# Altium footprint library KNR_Kurs.PcbLib: 250 footprints (part 5 of 16)
Each footprint in its own frame and in the unit in brackets; x right, y up, seen from the top. Pads: shape width x height; smd on the part's side, far side on the other; paste and mask are expansions set on the pad; w line width, h text height; cw(c..) or ccw(c..) is an arc to the next point about the centre after c.
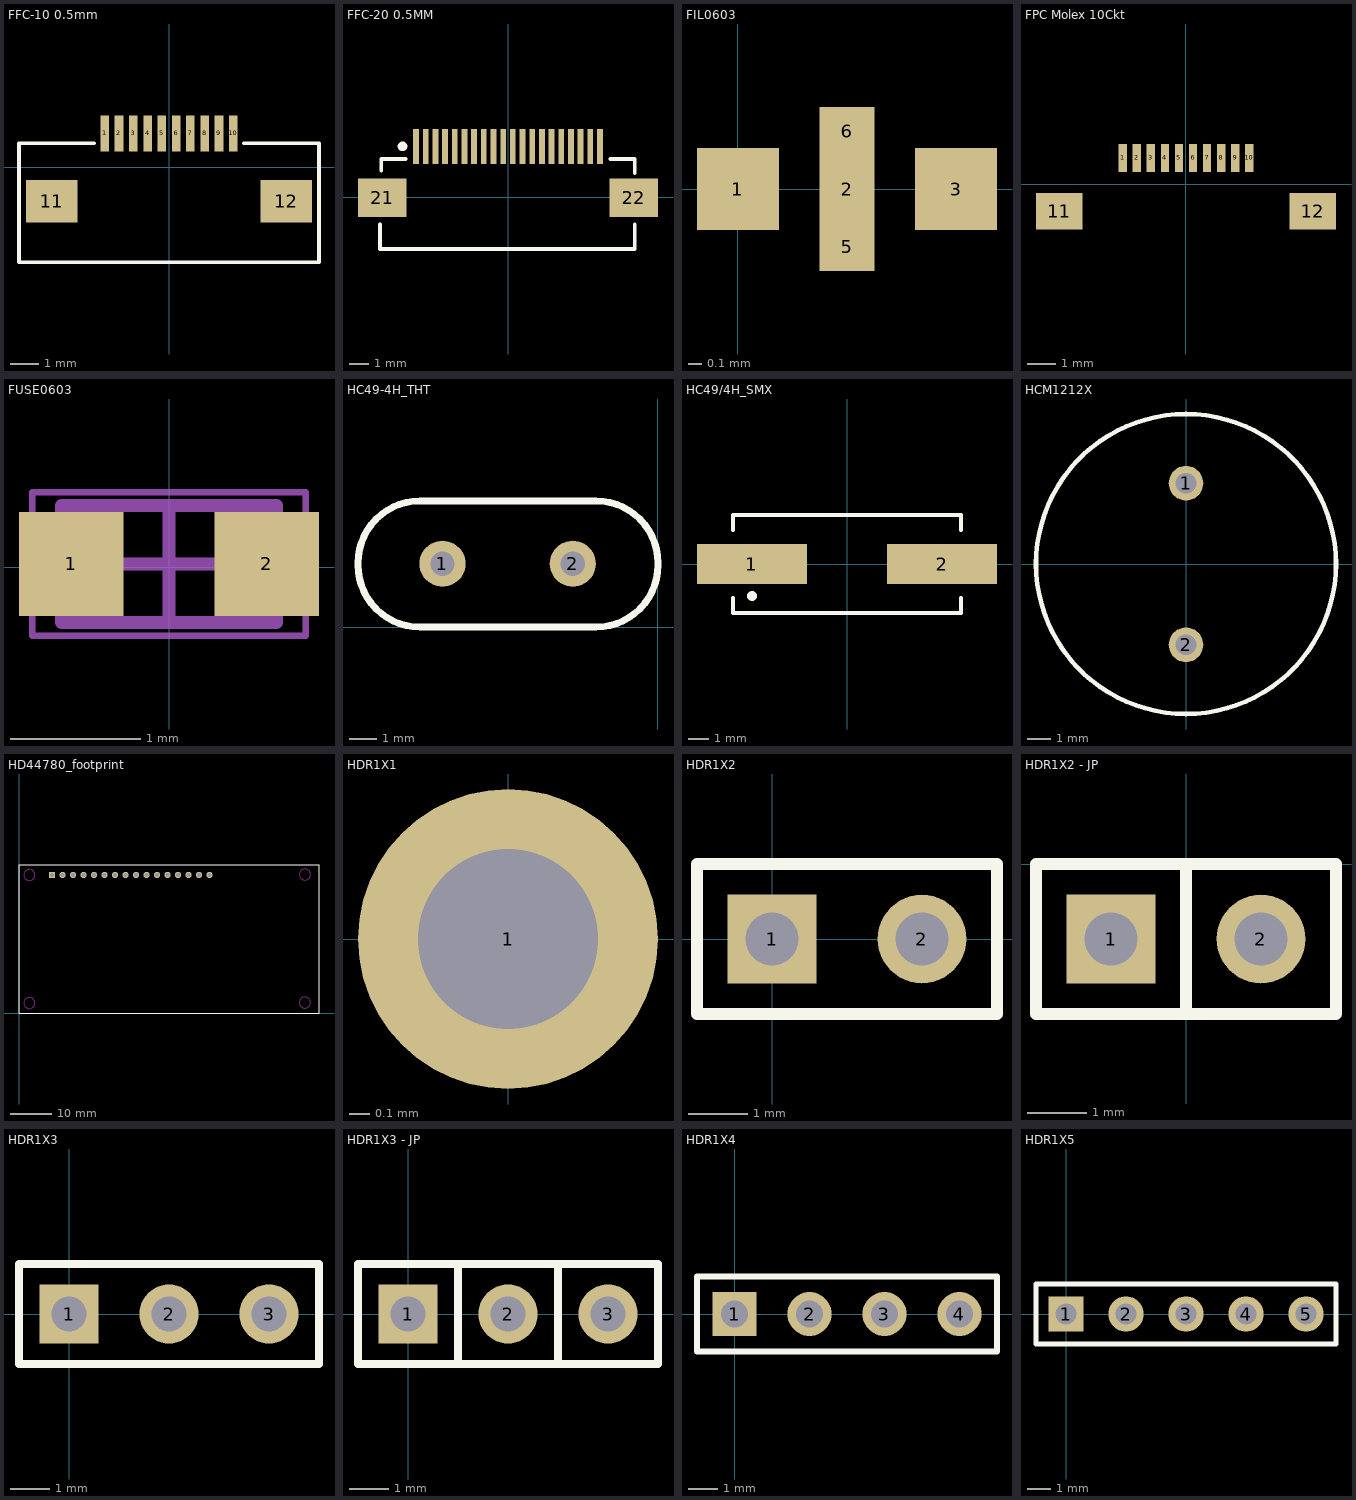
[diagram p4: the footprints below, top view; thin cyan lines are the x and y axes]

## FFC-10 0.5mm [mm] "FFC connector, r 0.5mm"
pads (12):
  rect 0.3x1.25 smd mask+0.102: 1(-2.25,1.188) 2(-1.75,1.188) 3(-1.25,1.188) 4(-0.75,1.188) 5(-0.25,1.188) 6(0.25,1.188) 7(0.75,1.188) 8(1.25,1.188) 9(1.75,1.188) 10(2.25,1.188)
  rect 1.8x1.5 smd: 11(-4.1,-1.187) 12(4.1,-1.187)
Top Overlay:
  lines w0.127: -2.625,0.85 -5.25,0.85 -5.25,-3.325 5.25,-3.325 5.25,0.85 2.625,0.85
3D body "ffc10.stp": height 1.85, standoff -0.02, extent -5.25,-3.325 5.25,1.575

## FFC-20 0.5MM [mm]
height 3
pads (22):
  rect 0.3x1.8 smd: 1(-4.75,2.625) 2(-4.25,2.625) 3(-3.75,2.625) 4(-3.25,2.625) 5(-2.75,2.625) 6(-2.25,2.625) 7(-1.75,2.625) 8(-1.25,2.625) 9(-0.75,2.625) 10(-0.25,2.625) 11(0.25,2.625) 12(0.75,2.625) 13(1.25,2.625) 14(1.75,2.625) 15(2.25,2.625) 16(2.75,2.625) 17(3.25,2.625) 18(3.75,2.625) 19(4.25,2.625) 20(4.75,2.625)
  rect 2.5x2 smd: 21(-6.5,-0.025) 22(6.5,-0.025)
Top Overlay:
  circle w0.25: c-5.45,2.625 r0.125
  lines w0.2: -6.604,-1.413 -6.604,-2.683 6.55,-2.683 6.55,-1.413 ; -6.55,1.381 -6.55,1.977 -5.3,1.977 ; 5.3,1.977 6.55,1.977 6.55,1.254

## FIL0603 [mm]
pads (5):
  rect 0.6x0.6 smd mask+0.07: 1(0,0) 3(1.6,0)
  rect 0.4x1.2 smd mask+0.07: 2(0.8,0)
  rect 0.5x0.45 on Top Solder mask+0.07: 5(0.8,-0.425) 6(0.8,0.425)
3D body "User Library-EMIFIL_0603.step": height 0.6, standoff 0, extent 0,-0.409 1.6,0.409

## FPC Molex 10Ckt [mm]
pads (12):
  rect 0.3x1 smd mask+0.07: 1(-2.25,0.95) 2(-1.75,0.95) 3(-1.25,0.95) 4(-0.75,0.95) 5(-0.25,0.95) 6(0.25,0.95) 7(0.75,0.95) 8(1.25,0.95) 9(1.75,0.95) 10(2.25,0.95)
  rect 1.65x1.3 smd mask+0.07: 11(-4.525,-0.95) 12(4.525,-0.95)
3D body "545501071.stp": height 1.2, standoff 0, extent -5.1,-3.85 5.1,1.15

## FUSE0603 [mm]
pads (2):
  rect 0.8x0.8 smd: 1(-0.75,0.025) 2(0.75,0.025)
Mechanical 13:
  lines w0.1: -0.825,-0.425 0.825,-0.425 0.825,0.475 -0.825,0.475 -0.825,-0.425
Mechanical 15:
  lines w0.05: -1.05,-0.525 1.05,-0.525 1.05,0.575 -1.05,0.575 -1.05,-0.525
  lines w0.1: -0.45,0.025 0.45,0.025 ; 0,-0.425 0,0.475
3D body "0603FUSE.stp": height 0.45, standoff 0, extent -0.775,-0.4 0.775,0.45

## HC49-4H_THT [mm] "HC49-4H package for oscillator"
pads (2):
  round 1.7 hole 0.9: 1(-7.938,2.337) 2(-3.138,2.337)
Top Overlay:
  lines w0.254: -11.05,2.286 ccw(c-8.764,2.286) -8.764,0 -2.286,0 ccw(c-2.286,2.286) 0,2.286 ; -11.05,2.364 cw(c-8.764,2.364) -8.764,4.65 -2.286,4.65 cw(c-2.286,2.364) 0,2.364
3D body "HC49-4H.stp": height 3.5, standoff -1.5, extent -11.113,0 -0.063,4.65

## HC49/4H_SMX [mm]
pads (2):
  rect 5.5x2 smd: 1(-4.75,0) 2(4.75,0)
Top Overlay:
  circle w0.25: c-4.75,-1.6 r0.125
  lines w0.2: -5.7,-1.7 -5.7,-2.45 5.7,-2.45 5.7,-1.7 ; -5.7,1.7 -5.7,2.45 5.7,2.45 5.7,1.7
3D body "XTAL_SMD.stp": height 3.9, standoff 0, extent -6.3,-2.3 6.2,2.35

## HCM1212X [mm] "Buzzer"
pads (2):
  round 1.5 hole 0.9: 1(0,3.5) 2(0,-3.5)
Top Overlay:
  circle w0.2: c0,0 r6.5
3D body "HCM1212X.stp": height 9.01, standoff -2, extent -5.98,-6 5.98,6

## HD44780_footprint [mm]
pads (16):
  rect 1.5x1.5 hole 0.9: 1(8,33.5)
  round 1.5 hole 0.9: 2(10.54,33.5) 3(13.08,33.5) 4(15.62,33.5) 5(18.16,33.5) 6(20.7,33.5) 7(23.24,33.5) 8(25.78,33.5) 9(28.32,33.5) 10(30.86,33.5) 11(33.4,33.5) 12(35.94,33.5) 13(38.48,33.5) 14(41.02,33.5) 15(43.56,33.5) 16(46.1,33.5)
Top Layer keep-out:
  circle w0.2: c2.5,33.5 r1.345
  circle w0.2: c69.2,33.6 r1.345
  circle w0.2: c69.2,2.6 r1.345
  circle w0.2: c2.5,2.5 r1.345
Top Overlay:
  lines w0.2: 0,0 0,36 72.6,36 72.6,0 0,0

## HDR1X1 [mm] "Header, 1-Pin"
pads (1):
  round 1.5 hole 0.9: 1(0,0)
3D body "HDR1X1.stp": height 8.54, standoff -3, extent -1.34,-1.17 1.2,1.37

## HDR1X2 [mm] "Connector; Header; 2 Position"
pads (2):
  rect 1.5x1.5 hole 0.9: 1(0,0)
  round 1.5 hole 0.9: 2(2.54,0)
Top Overlay:
  lines w0.2: -1.27,-1.27 3.81,-1.27 3.81,1.27 -1.27,1.27 -1.27,-1.27
3D body "HDR1X2.stp": height 8.54, standoff -3, extent -1.27,-1.245 3.81,1.295

## HDR1X2 - JP [mm] "Connector; Header; 2 Position, Jumper"
pads (2):
  rect 1.5x1.5 hole 0.9: 1(-1.27,-1.27)
  round 1.5 hole 0.9: 2(1.27,-1.27)
Top Overlay:
  lines w0.2: 0,-2.515 0,0 ; -2.54,-2.54 -2.54,0 2.54,0 2.54,-2.54 -2.54,-2.54
3D body "HDR1X2.stp": height 8.54, standoff -3, extent -2.54,-2.515 2.54,0.025

## HDR1X3 [mm] "Connector; Header; 3 Position"
pads (3):
  rect 1.5x1.5 hole 0.9: 1(0,0)
  round 1.5 hole 0.9: 2(2.54,0) 3(5.08,0)
Top Overlay:
  lines w0.2: -1.27,-1.27 -1.27,1.27 6.35,1.27 6.35,-1.27 -1.27,-1.27
3D body "HDR1X3.stp": height 8.54, standoff -3, extent -1.27,-1.245 6.35,1.295

## HDR1X3 - JP [mm] "Connector; Header; 3 Position, Jumper"
pads (3):
  rect 1.5x1.5 hole 0.9: 1(0,0)
  round 1.5 hole 0.9: 2(2.54,0) 3(5.08,0)
Top Overlay:
  lines w0.2: 1.27,-1.245 1.27,1.27 ; 3.81,-1.245 3.81,1.27 ; -1.27,-1.27 6.35,-1.27 6.35,1.27 -1.27,1.27 -1.27,-1.27
3D body "HDR1X3.stp": height 8.54, standoff -3, extent -1.27,-1.245 6.35,1.295

## HDR1X4 [mm] "Connector; Header; 4 Position"
pads (4):
  rect 1.5x1.5 hole 0.9: 1(0,0)
  round 1.5 hole 0.9: 2(2.54,0) 3(5.08,0) 4(7.62,0)
Top Overlay:
  lines w0.2: -1.27,-1.27 8.89,-1.27 8.89,1.27 -1.27,1.27 -1.27,-1.27
3D body "HDR1X4.stp": height 8.54, standoff -3, extent -1.27,-1.27 8.89,1.27

## HDR1X5 [mm] "Connector; Header; 5 Position"
pads (5):
  rect 1.5x1.5 hole 0.9: 1(0,0)
  round 1.5 hole 0.9: 2(2.54,0) 3(5.08,0) 4(7.62,0) 5(10.16,0)
Top Overlay:
  lines w0.2: -1.27,-1.27 -1.27,1.27 11.43,1.27 11.43,-1.27 -1.27,-1.27
3D body "HDR1X5.stp": height 8.54, standoff -3, extent -1.27,-1.27 11.43,1.27